# Altium footprint library SMT.PcbLib: 379 footprints (part 13 of 24) (continued)
## QFN50P1200X1200X90_HS-89N [mm] "QFN, 88-Leads, Body 12,00x12,00mm, Pitch 0,50mm, Thermal Pad 7,40x7,40mm, IPC Medium Density"
height 0.9
pads (89):
  rrect70% 1x0.3 smd paste+0 mask+0.03: 1(-6,5.25) 22(-6,-5.25) 45(6,-5.25) 66(6,5.25)
  rrect70% 1x0.3 smd paste+0 mask+0.04: 2(-6,4.75) 3(-6,4.25) 4(-6,3.75) 5(-6,3.25) 6(-6,2.75) 7(-6,2.25) 8(-6,1.75) 9(-6,1.25) 10(-6,0.75) 11(-6,0.25) 12(-6,-0.25) 13(-6,-0.75) 14(-6,-1.25) 15(-6,-1.75) 16(-6,-2.25) 17(-6,-2.75) 18(-6,-3.25) 19(-6,-3.75) 20(-6,-4.25) 21(-6,-4.75) 46(6,-4.75) 47(6,-4.25) 48(6,-3.75) 49(6,-3.25) 50(6,-2.75) 51(6,-2.25) 52(6,-1.75) 53(6,-1.25) 54(6,-0.75) 55(6,-0.25) 56(6,0.25) 57(6,0.75) 58(6,1.25) 59(6,1.75) 60(6,2.25) 61(6,2.75) 62(6,3.25) 63(6,3.75) 64(6,4.25) 65(6,4.75)
  rrect70% 0.3x1 smd paste+0 mask+0.03: 23(-5.25,-6) 44(5.25,-6) 67(5.25,6) 88(-5.25,6)
  rrect70% 0.3x1 smd paste+0 mask+0.04: 24(-4.75,-6) 25(-4.25,-6) 26(-3.75,-6) 27(-3.25,-6) 28(-2.75,-6) 29(-2.25,-6) 30(-1.75,-6) 31(-1.25,-6) 32(-0.75,-6) 33(-0.25,-6) 34(0.25,-6) 35(0.75,-6) 36(1.25,-6) 37(1.75,-6) 38(2.25,-6) 39(2.75,-6) 40(3.25,-6) 41(3.75,-6) 42(4.25,-6) 43(4.75,-6) 68(4.75,6) 69(4.25,6) 70(3.75,6) 71(3.25,6) 72(2.75,6) 73(2.25,6) 74(1.75,6) 75(1.25,6) 76(0.75,6) 77(0.25,6) 78(-0.25,6) 79(-0.75,6) 80(-1.25,6) 81(-1.75,6) 82(-2.25,6) 83(-2.75,6) 84(-3.25,6) 85(-3.75,6) 86(-4.25,6) 87(-4.75,6)
  rect 7.55x7.55 hole 0.3 copper offset 0.6,0.6 mask-20: EPAD(-0.6,-0.6)
via -3.1,3.1 diameter 0.7 hole 0.3
via -1.9,3.1 diameter 0.7 hole 0.3
via -3.1,1.9 diameter 0.7 hole 0.3
via -1.9,1.9 diameter 0.7 hole 0.3
via 0.6,1.9 diameter 0.7 hole 0.3
via -0.6,1.9 diameter 0.7 hole 0.3
via 0.6,3.1 diameter 0.7 hole 0.3
via -0.6,3.1 diameter 0.7 hole 0.3
via 0.6,-0.6 diameter 0.7 hole 0.3
via 0.6,0.6 diameter 0.7 hole 0.3
via -0.6,0.6 diameter 0.7 hole 0.3
via -1.9,-0.6 diameter 0.7 hole 0.3
via -3.1,-0.6 diameter 0.7 hole 0.3
via -1.9,0.6 diameter 0.7 hole 0.3
via -3.1,0.6 diameter 0.7 hole 0.3
via -1.9,-3.1 diameter 0.7 hole 0.3
via -3.1,-3.1 diameter 0.7 hole 0.3
via -1.9,-1.9 diameter 0.7 hole 0.3
via -3.1,-1.9 diameter 0.7 hole 0.3
via 0.6,-3.1 diameter 0.7 hole 0.3
via -0.6,-3.1 diameter 0.7 hole 0.3
via 0.6,-1.9 diameter 0.7 hole 0.3
via -0.6,-1.9 diameter 0.7 hole 0.3
via 3.1,-3.1 diameter 0.7 hole 0.3
via 1.9,-3.1 diameter 0.7 hole 0.3
via 3.1,-1.9 diameter 0.7 hole 0.3
via 1.9,-1.9 diameter 0.7 hole 0.3
via 3.1,-0.6 diameter 0.7 hole 0.3
via 1.9,-0.6 diameter 0.7 hole 0.3
via 3.1,0.6 diameter 0.7 hole 0.3
via 1.9,0.6 diameter 0.7 hole 0.3
via 3.1,1.9 diameter 0.7 hole 0.3
via 1.9,1.9 diameter 0.7 hole 0.3
via 3.1,3.1 diameter 0.7 hole 0.3
via 1.9,3.1 diameter 0.7 hole 0.3
Top Overlay:
  circle w0.15: c-6.85,5.925 r0.25
  lines w0.15: -6.2,-5.75 -6.2,-6.075 -5.75,-6.075 ; -6.2,5.75 -6.2,6.075 -5.75,6.075 ; 5.75,-6.075 6.2,-6.075 6.2,-5.75 ; 5.75,6.075 6.2,6.075 6.2,5.75
Top Paste:
  region: 1.515,-1.515 3.485,-1.515 3.485,-3.485 1.515,-3.485
  region: -0.985,-1.515 0.985,-1.515 0.985,-3.485 -0.985,-3.485
  region: -3.485,-1.515 -1.515,-1.515 -1.515,-3.485 -3.485,-3.485
  region: -3.485,0.985 -1.515,0.985 -1.515,-0.985 -3.485,-0.985
  region: -0.985,0.985 0.985,0.985 0.985,-0.985 -0.985,-0.985
  region: 1.515,0.985 3.485,0.985 3.485,-0.985 1.515,-0.985
  region: 1.515,3.485 3.485,3.485 3.485,1.515 1.515,1.515
  region: -0.985,3.485 0.985,3.485 0.985,1.515 -0.985,1.515
  region: -3.485,3.485 -1.515,3.485 -1.515,1.515 -3.485,1.515
Top Solder:
  region: 1.35,-1.35 3.65,-1.35 3.65,-3.65 1.35,-3.65
  region: -1.15,-1.35 1.15,-1.35 1.15,-3.65 -1.15,-3.65
  region: -3.65,-1.35 -1.35,-1.35 -1.35,-3.65 -3.65,-3.65
  region: 1.35,3.65 3.65,3.65 3.65,1.35 1.35,1.35
  region: -1.15,3.65 1.15,3.65 1.15,1.35 -1.15,1.35
  region: -3.65,3.65 -1.35,3.65 -1.35,1.35 -3.65,1.35
  region: 1.35,1.15 3.65,1.15 3.65,-1.15 1.35,-1.15
  region: -3.65,1.15 -1.35,1.15 -1.35,-1.15 -3.65,-1.15
  region: -1.15,1.15 1.15,1.15 1.15,-1.15 -1.15,-1.15
Bottom Solder:
  region: -4.005,4 4,4 4,-4 -4,-4
Mechanical 1:
  circle w0.2: c-5.1,4.975 r0.25
  lines w0.2: -6.05,-6.05 6.05,-6.05 6.05,6.05 -6.05,6.05 -6.05,-6.05
3D body "User Library-LFCSP_VQ88(CP-88-5).STEP": height 0.8, standoff 0, extent -6.01,-6.01 6.05,6.05

## QFN51P300X300X89_HS-13N [mm] "QFN, 12-Leads, Body 3,00x3,00mm, Pitch 0,51mm, Thermal Pad 1,45x1,45mm, IPC Medium Density"
height 0.89
pads (13):
  rect 0.51x0.25 smd paste+0 mask+0.05: 1(-1.36,0.51) 2(-1.36,0) 3(-1.36,-0.51) 7(1.36,-0.51) 8(1.36,0) 9(1.36,0.51)
  rect 0.25x0.51 smd paste+0 mask+0.05: 4(-0.51,-1.36) 5(0,-1.36) 6(0.51,-1.36) 10(0.51,1.36) 11(0,1.36) 12(-0.51,1.36)
  rect 1.25x1.25 hole 0.2 paste+0.1: EPAD(0,0)
via 0,0.4 diameter 0.45 hole 0.2
via 0,-0.4 diameter 0.45 hole 0.2
via 0.4,0 diameter 0.45 hole 0.2
via -0.4,0 diameter 0.45 hole 0.2
via -0.4,0.4 diameter 0.45 hole 0.2
via -0.4,-0.4 diameter 0.45 hole 0.2
via 0.4,-0.4 diameter 0.45 hole 0.2
via 0.4,0.4 diameter 0.45 hole 0.2
Top Overlay:
  circle w0.15: c-2.3,0.9 r0.25
  lines w0.15: -1.65,-1 -1.65,-1.65 -1,-1.65 ; -1.65,1 -1.65,1.65 -1,1.65 ; 1,-1.65 1.65,-1.65 1.65,-1 ; 1,1.65 1.65,1.65 1.65,1
Top Paste:
  rectangle: -0.5,-0.5 0.5,0.5
Mechanical 1:
  circle w0.2: c-0.9,0.9 r0.25
  lines w0.2: -1.5,-1.5 1.5,-1.5 1.5,1.5 -1.5,1.5 -1.5,-1.5
Mechanical 5:
  lines w0.1: -0.8,-0.8 0.8,-0.8 0.8,0.8 -0.8,0.8 -0.8,-0.8
Mechanical 20:
  text "Рекомендуется заполнить /  отверстия (слой Mech5)" at -4.4,1.8 h1
3D body "GP2X1.stp": height 0.89, standoff 0, extent -1.5,-1.5 1.5,1.5

## QFN51P500X500X100_HS-33N [mm] "QFN, 32-Leads, Body 5,00x5,00mm, Pitch 0,51mm, Thermal Pad 2,80x2,80mm, IPC Medium Density"
height 1
pads (33):
  oval 0.9x0.3 smd paste-0.01 mask+0.04: 1(-2.45,1.785) 2(-2.45,1.275) 3(-2.45,0.765) 4(-2.45,0.255) 5(-2.45,-0.255) 6(-2.45,-0.765) 7(-2.45,-1.275) 8(-2.45,-1.785) 17(2.45,-1.785) 18(2.45,-1.275) 19(2.45,-0.765) 20(2.45,-0.255) 21(2.45,0.255) 22(2.45,0.765) 23(2.45,1.275) 24(2.45,1.785)
  oval 0.3x0.9 smd paste-0.01 mask+0.04: 9(-1.785,-2.45) 10(-1.275,-2.45) 11(-0.765,-2.45) 12(-0.255,-2.45) 13(0.255,-2.45) 14(0.765,-2.45) 15(1.275,-2.45) 16(1.785,-2.45) 25(1.785,2.45) 26(1.275,2.45) 27(0.765,2.45) 28(0.255,2.45) 29(-0.255,2.45) 30(-0.765,2.45) 31(-1.275,2.45) 32(-1.785,2.45)
  rect 2.8x2.8 hole 0.3 mask+0.03: EPAD(0,0)
via -1.6,0 diameter 0.55 hole 0.3
via -1.016,0 diameter 0.55 hole 0.3
via -0.508,0 diameter 0.55 hole 0.3
via 0,0.508 diameter 0.55 hole 0.3
via 0,1.016 diameter 0.55 hole 0.3
via 0.508,0 diameter 0.55 hole 0.3
via 1.016,0 diameter 0.55 hole 0.3
via 1.6,0 diameter 0.55 hole 0.3
via 0,1.6 diameter 0.55 hole 0.3
via 0.508,1.6 diameter 0.55 hole 0.3
via 0.508,1.016 diameter 0.55 hole 0.3
via 0.508,0.508 diameter 0.55 hole 0.3
via 1.016,1.6 diameter 0.55 hole 0.3
via 1.016,1.016 diameter 0.55 hole 0.3
via 1.016,0.508 diameter 0.55 hole 0.3
via 1.6,1.6 diameter 0.55 hole 0.3
via 1.6,1.016 diameter 0.55 hole 0.3
via 1.6,0.508 diameter 0.55 hole 0.3
via -0.508,1.6 diameter 0.55 hole 0.3
via -0.508,1.016 diameter 0.55 hole 0.3
via -0.508,0.508 diameter 0.55 hole 0.3
via -1.016,1.6 diameter 0.55 hole 0.3
via -1.016,1.016 diameter 0.55 hole 0.3
via -1.016,0.508 diameter 0.55 hole 0.3
via -1.6,1.6 diameter 0.55 hole 0.3
via -1.6,1.016 diameter 0.55 hole 0.3
via -1.6,0.508 diameter 0.55 hole 0.3
via -1.6,-1.6 diameter 0.55 hole 0.3
via -1.6,-1.016 diameter 0.55 hole 0.3
via -1.6,-0.508 diameter 0.55 hole 0.3
via -1.016,-1.6 diameter 0.55 hole 0.3
via -1.016,-1.016 diameter 0.55 hole 0.3
via -1.016,-0.508 diameter 0.55 hole 0.3
via -0.508,-1.6 diameter 0.55 hole 0.3
via -0.508,-1.016 diameter 0.55 hole 0.3
via -0.508,-0.508 diameter 0.55 hole 0.3
via 0,-1.6 diameter 0.55 hole 0.3
via 0,-1.016 diameter 0.55 hole 0.3
via 0,-0.508 diameter 0.55 hole 0.3
via 0.508,-1.6 diameter 0.55 hole 0.3
via 0.508,-1.016 diameter 0.55 hole 0.3
via 0.508,-0.508 diameter 0.55 hole 0.3
via 1.016,-1.6 diameter 0.55 hole 0.3
via 1.016,-1.016 diameter 0.55 hole 0.3
via 1.016,-0.508 diameter 0.55 hole 0.3
via 1.6,-1.6 diameter 0.55 hole 0.3
via 1.6,-1.016 diameter 0.55 hole 0.3
via 1.6,-0.508 diameter 0.55 hole 0.3
Top Overlay:
  circle w0.15: c-3.3,2.5 r0.25
  lines w0.15: -2.65,-2.31 -2.65,-2.65 -2.31,-2.65 ; -2.65,2.31 -2.65,2.65 -2.31,2.65 ; 2.31,-2.65 2.65,-2.65 2.65,-2.31 ; 2.31,2.65 2.65,2.65 2.65,2.31
Top Paste:
  rectangle: -1.2,-1.2 -0.2,-0.2
  region: 1.2,-0.2 0.2,-0.2 0.2,-1.2 1.2,-1.2
  region: 1.2,1.2 0.2,1.2 0.2,0.2 1.2,0.2
  rectangle: -1.2,0.2 -0.2,1.2
Mechanical 1:
  circle w0.2: c-1.55,1.55 r0.25
  lines w0.2: -2.5,-2.5 -2.5,2.5 2.5,2.5 2.5,-2.5 -2.5,-2.5
Mechanical 5:
  lines w0.15: -1.9,-1.9 -1.9,1.9 1.9,1.9 1.9,-1.9 -1.9,-1.9
Mechanical 20:
  text "Рекомендуется заполнение отверстий  / Прошивка см. PDF / Шаг отв.0,5  для материала не более 0,254" at -7.9,3 h1
3D body "QFN51P500X500X100_HS-33N.step": height 1, standoff 0, extent -2.501,-2.501 2.501,2.501

## QFN65P400X400X80_HS215X215-17N [mm] "QFN, 16-Leads, Body 4,00x4,00mm, Pitch 0,65mm, Thermal Pad 2,15x2,15mm, IPC Medium Density"
height 0.8
pads (17):
  rrect50% 0.72x0.3 smd mask+0.05: 1(-1.815,0.975) 2(-1.815,0.325) 3(-1.815,-0.325) 4(-1.815,-0.975) 9(1.815,-0.975) 10(1.815,-0.325) 11(1.815,0.325) 12(1.815,0.975)
  rrect50% 0.3x0.72 smd mask+0.05: 5(-0.975,-1.815) 6(-0.325,-1.815) 7(0.325,-1.815) 8(0.975,-1.815) 13(0.975,1.815) 14(0.325,1.815) 15(-0.325,1.815) 16(-0.975,1.815)
  rect 2.15x2.15 hole 0.3 copper offset 0.25,0.25: EPAD(-0.25,-0.25)
via 0.25,-0.25 diameter 0.6 hole 0.3
via 0.75,0.25 diameter 0.6 hole 0.3
via 0.75,-0.25 diameter 0.6 hole 0.3
via -0.75,0.25 diameter 0.6 hole 0.3
via -0.75,-0.25 diameter 0.6 hole 0.3
via 0.25,0.75 diameter 0.6 hole 0.3
via -0.25,0.75 diameter 0.6 hole 0.3
via -0.75,0.75 diameter 0.6 hole 0.3
via 0.75,0.75 diameter 0.6 hole 0.3
via 0.75,-0.75 diameter 0.6 hole 0.3
via -0.25,-0.75 diameter 0.6 hole 0.3
via 0.25,-0.75 diameter 0.6 hole 0.3
via 0.25,0.25 diameter 0.6 hole 0.3
via -0.25,0.25 diameter 0.6 hole 0.3
via -0.75,-0.75 diameter 0.6 hole 0.3
Top Overlay:
  circle w0.15: c-2.75,1 r0.25
  lines w0.15: -2.15,-1.5 -2.15,-2.15 -1.5,-2.15 ; -2.15,1.5 -2.15,2.15 -1.5,2.15 ; 1.5,-2.15 2.15,-2.15 2.15,-1.5 ; 1.5,2.15 2.15,2.15 2.15,1.5
Top Paste:
  rectangle: -0.9,0.2 -0.2,0.9
  region: 0.9,0.9 0.2,0.9 0.2,0.2 0.9,0.2
  region: 0.9,-0.2 0.2,-0.2 0.2,-0.9 0.9,-0.9
  rectangle: -0.9,-0.9 -0.2,-0.2
Mechanical 1:
  circle w0.2: c-1.25,1.25 r0.25
  lines w0.2: -2,-2 -2,2 2,2 2,-2 -2,-2
3D body "User Library-QFN-16-1.STEP": height 0.86, standoff 0.01, extent -2.085,-2.085 2.085,2.085

## QFN65P400X400X80_HS-17N [mm] "QFN, 16-Leads, Body 4,00x4,00mm, Pitch 0,65mm, Thermal Pad 2,10x2,10mm, IPC Medium Density"
height 0.8
pads (17):
  rrect50% 0.8x0.3 smd mask+0.03: 1(-1.8,0.975) 2(-1.8,0.325) 3(-1.8,-0.325) 4(-1.8,-0.975) 9(1.8,-0.975) 10(1.8,-0.325) 11(1.8,0.325) 12(1.8,0.975)
  rrect50% 0.3x0.8 smd mask+0.03: 5(-0.975,-1.8) 6(-0.325,-1.8) 7(0.325,-1.8) 8(0.975,-1.8) 13(0.975,1.8) 14(0.325,1.8) 15(-0.325,1.8) 16(-0.975,1.8)
  rect 2.1x2.1 hole 0.3: EPAD(0,0)
via -0.55,0.55 diameter 0.5 hole 0.2
via 0.55,0.55 diameter 0.5 hole 0.2
via -0.55,-0.55 diameter 0.5 hole 0.2
via 0.55,-0.55 diameter 0.5 hole 0.2
Top Overlay:
  circle w0.15: c-2.75,1 r0.25
  lines w0.15: -2.15,-1.5 -2.15,-2.15 -1.5,-2.15 ; -2.15,1.5 -2.15,2.15 -1.5,2.15 ; 1.5,-2.15 2.15,-2.15 2.15,-1.5 ; 1.5,2.15 2.15,2.15 2.15,1.5
Top Paste:
  rectangle: -0.9,0.2 -0.2,0.9
  region: 0.9,0.9 0.2,0.9 0.2,0.2 0.9,0.2
  region: 0.9,-0.2 0.2,-0.2 0.2,-0.9 0.9,-0.9
  rectangle: -0.9,-0.9 -0.2,-0.2
Mechanical 1:
  circle w0.2: c-1.25,1.25 r0.25
  lines w0.2: -2,-2 -2,2 2,2 2,-2 -2,-2
3D body "User Library-QFN-16-1.STEP": height 0.86, standoff 0.01, extent -2.085,-2.085 2.085,2.085

## QFN65P400X400X100_HS-17N [mm] "QFN, 16-Leads, Body 4,00x4,00mm, Pitch 0,65mm, Thermal Pad 2,65x2,65mm, IPC Medium Density"
height 1
pads (17):
  oval 0.65x0.3 smd: 1(-2.025,0.975) 2(-2.025,0.325) 3(-2.025,-0.325) 4(-2.025,-0.975) 9(2.025,-0.975) 10(2.025,-0.325) 11(2.025,0.325) 12(2.025,0.975)
  oval 0.3x0.65 smd: 5(-0.975,-2.025) 6(-0.325,-2.025) 7(0.325,-2.025) 8(0.975,-2.025) 13(0.975,2.025) 14(0.325,2.025) 15(-0.325,2.025) 16(-0.975,2.025)
  rect 2.65x2.65 hole 0.3: EPAD(0,0)
via 0.6,-0.6 diameter 0.6 hole 0.3
via -0.6,-0.6 diameter 0.6 hole 0.3
via 0.6,0.6 diameter 0.6 hole 0.3
via -0.6,0.6 diameter 0.6 hole 0.3
Top Overlay:
  circle w0.15: c-2.8,1.4 r0.25
  lines w0.15: -2.15,-1.5 -2.15,-2.15 -1.5,-2.15 ; -2.15,1.5 -2.15,2.15 -1.5,2.15 ; 1.5,-2.15 2.15,-2.15 2.15,-1.5 ; 1.5,2.15 2.15,2.15 2.15,1.5
Top Paste:
  rectangle: -1,0.2 -0.2,1
  rectangle: 0.2,0.2 1,1
  rectangle: 0.2,-1 1,-0.2
  rectangle: -1,-1 -0.2,-0.2
Mechanical 1:
  circle w0.2: c-1.1,1 r0.25
  lines w0.2: -2,-2 2,-2 2,2 -2,2 -2,-2
3D body "User Library-QFN-16-1.STEP": height 0.86, standoff 0.01, extent -2.085,-2.085 2.085,2.085

## QFN66P300X300X89_HS-9N [mm] "QFN, 8-Leads, Body 3,00x3,00mm, Pitch 0,66mm, Thermal Pad 1,70x1,70mm, IPC Medium Density"
height 0.89
pads (9):
  rrect50% 0.8x0.3 smd mask+0.03: 1(-1.485,0.33) 2(-1.485,-0.33) 5(1.485,-0.33) 6(1.485,0.33)
  rrect50% 0.3x0.8 smd mask+0.03: 3(-0.33,-1.485) 4(0.33,-1.485) 7(0.33,1.485) 8(-0.33,1.485)
  rect 1.7x1.7 hole 0.3: EPAD(0,0)
via 0.5,0.5 diameter 0.6 hole 0.3
via -0.5,0.5 diameter 0.6 hole 0.3
via -0.5,-0.5 diameter 0.6 hole 0.3
via 0.5,-0.5 diameter 0.6 hole 0.3
Top Overlay:
  circle w0.15: c-2.5,0.25 r0.25
  lines w0.15: -1.65,-0.855 -1.65,-1.65 -0.855,-1.65 ; -1.65,0.855 -1.65,1.65 -0.855,1.65 ; 0.855,-1.65 1.65,-1.65 1.65,-0.855 ; 0.855,1.65 1.65,1.65 1.65,0.855
Top Paste:
  rectangle: -0.65,-0.65 0.65,0.65
Mechanical 1:
  circle w0.2: c-1,0.75 r0.25
  lines w0.2: -1.5,-1.5 1.5,-1.5 1.5,1.5 -1.5,1.5 -1.5,-1.5
3D body "QFN66P300X300X89_HS-9N.stp": height 0.96, standoff 0.01, extent -1.5,-1.5 1.5,1.5

## QFN80P400X400X80_HS-11N [mm] "QFN, 10-Leads, Body 4,00x4,00mm, Pitch 0,80mm, Thermal Pad 3,00x2,60mm, IPC Medium Density"
height 0.8
pads (11):
  rrect50% 0.35x0.85 smd paste-0.05 mask+0.07: 1(-1.6,-2) 2(-0.8,-2) 3(0,-2) 4(0.8,-2) 5(1.6,-2) 6(1.6,2) 7(0.8,2) 8(0,2) 9(-0.8,2) 10(-1.6,2)
  rect 3x2.6 hole 0.3 paste-10 mask+0.07: EPAD(0,0)
via 0.75,0.75 diameter 0.7 hole 0.3
via 0.75,-0.75 diameter 0.7 hole 0.3
via -0.75,0.75 diameter 0.7 hole 0.3
via -0.75,-0.75 diameter 0.7 hole 0.3
Top Overlay:
  circle w0.2: c-2.3,-2.6 r0.25
  lines w0.15: -2.2,-2 -2.2,2 ; 2.2,-1.9 2.2,2
Top Paste:
  rectangle: 0.15,0.15 1.3,1.3
  rectangle: 0.15,-1.3 1.3,-0.15
  region: -0.15,-0.15 -1.3,-0.15 -1.3,-1.3 -0.15,-1.3
  region: -0.15,1.3 -1.3,1.3 -1.3,0.15 -0.15,0.15
Mechanical 1:
  circle w0.2: c-1.3,-1.4 r0.25
  lines w0.2: -2,-2 -2,2 2,2 2,-2 -2,-2
3D body "DPR (S-PWSON-N10).stp": height 0.8, standoff 0, extent -2,-2 2,2

## QFN90P900X1100X290-32N [mm] "QFN, 32-Leads, Body 9,00x11,00mm, Pitch 0,90mm, IPC Medium Density"
height 2.9
pads (41):
  rect 1.7x1.6 smd paste-5 mask+0.07: 1(-5.05,-4.1) 11(5.05,-4.1) 19(5.05,4.1) 29(-5.05,4.1)
  rect 0.6x0.95 smd paste-0.025 mask+0.07: 2(-3.6,-4.425) 3(-2.7,-4.425) 4(-1.8,-4.425) 5(-0.9,-4.425) 6(0,-4.425) 7(0.9,-4.425) 8(1.8,-4.425) 9(2.7,-4.425) 10(3.6,-4.425) 20(3.6,4.425) 21(2.7,4.425) 22(1.8,4.425) 23(0.9,4.425) 24(0,4.425) 25(-0.9,4.425) 26(-1.8,4.425) 27(-2.7,4.425) 28(-3.6,4.425)
  rect 0.95x0.6 smd paste-0.025 mask+0.07: 12(5.425,-2.7) 13(5.425,-1.8) 14(5.425,-0.9) 15(5.425,0) 16(5.425,0.9) 17(5.425,1.8) 18(5.425,2.7) 30(-5.425,2.7) 31(-5.425,1.8) 32(-5.425,0.9) 33(-5.425,0) 34(-5.425,-0.9) 35(-5.425,-1.8) 36(-5.425,-2.7)
  rect 2.3x2.25 smd paste-10 mask+0.07: 37(-3.3,-0.22)
  rect 2.2x3.1 smd paste-10 mask+0.07: 38(0.11,-1.3) 39(3.59,-1.3)
  rect 1.24x1.4 smd paste-10 mask+0.07: 40(4.06,2.33)
  rect 3.05x2.04 smd paste-10 mask+0.07: 41(1.32,2.65)
via -4.08,0.64 diameter 0.52 hole 0.3
via -3.3,0.64 diameter 0.52 hole 0.3
via -2.52,0.64 diameter 0.52 hole 0.3
via -2.52,-1.08 diameter 0.52 hole 0.3
via -3.3,-1.08 diameter 0.52 hole 0.3
via -4.08,-1.08 diameter 0.52 hole 0.3
Top Overlay:
  circle w0.15: c-5,-5.7 r0.25
  lines w0.15: -6.15,-3.375 -6.15,-5.1 -4.275,-5.1 ; -6.15,3.375 -6.15,5.1 -4.275,5.1 ; 4.275,-5.1 6.15,-5.1 6.15,-3.375 ; 4.275,5.1 6.15,5.1 6.15,3.375
Top Paste:
  rectangle: 3.54,2.48 4.58,2.98
  rectangle: 3.54,1.68 4.58,2.18
  rectangle: 2.64,-2.73 3.44,-1.45
  rectangle: 3.74,-2.73 4.54,-1.45
  rectangle: 3.74,-1.15 4.54,0.13
  rectangle: 2.64,-1.15 3.44,0.13
  rectangle: -0.84,-1.15 -0.04,0.13
  rectangle: 0.26,-1.15 1.06,0.13
  rectangle: 0.26,-2.73 1.06,-1.45
  rectangle: -0.84,-2.73 -0.04,-1.45
  rectangle: -3.15,-0.645 -2.3,0.205
  rectangle: -4.3,-0.645 -3.45,0.205
  rectangle: -5.787,3.48 -4.315,4.72
  rectangle: 4.313,3.48 5.785,4.72
  rectangle: 4.313,-4.72 5.785,-3.48
  rectangle: -5.787,-4.72 -4.315,-3.48
  rectangle: -0.11,1.77 1.17,2.5
  rectangle: -0.11,2.8 1.17,3.53
  rectangle: 1.47,2.8 2.75,3.53
  rectangle: 1.47,1.77 2.75,2.5
Top Solder:
  rectangle: -4.52,-0.77 -2.08,0.33
Mechanical 1:
  circle w0.2: c-4.55,-3.55 r0.25
  lines w0.2: -5.5,-4.5 5.5,-4.5 5.5,4.5 -5.5,4.5 -5.5,-4.5
3D body: height 0.25, standoff 0, extent -4.922,-9.024 -4.922,-9.024
3D body "RKG0041A.stp": height 2.9, standoff 0, extent -5.5,-4.5 5.5,4.5

## QFN127P600X500X80_HS-9N [mm] "QFN, 8-Leads, Body 6,00x5,00mm, Pitch 0,00mm/1,27mm, Thermal Pad 3,00x3,00mm, IPC Medium Density"
height 0.8
pads (9):
  rect 1.05x0.4 smd: 1(-2.9,1.905) 2(-2.9,0.635) 3(-2.9,-0.635) 4(-2.9,-1.905) 5(2.9,-1.905) 6(2.9,-0.635) 7(2.9,0.635) 8(2.9,1.905)
  rect 3x3 hole 0.3: EPAD(0,0)
via 1.1,-1.1 diameter 0.7 hole 0.3
via 0,-1.1 diameter 0.7 hole 0.3
via -1.1,-1.1 diameter 0.7 hole 0.3
via 1.1,0 diameter 0.7 hole 0.3
via -1.1,0 diameter 0.7 hole 0.3
via 1.1,1.1 diameter 0.7 hole 0.3
via 0,1.1 diameter 0.7 hole 0.3
via -1.1,1.1 diameter 0.7 hole 0.3
Top Overlay:
  circle w0.15: c-3.8,2.5 r0.25
  lines w0.15: -3.2,-2.4 -3.2,-2.7 3.2,-2.7 3.2,-2.4 ; -3.2,2.4 -3.2,2.7 3.2,2.7 3.2,2.4
Top Paste:
  rectangle: -0.9,-0.9 0.9,0.9
Mechanical 1:
  circle w0.2: c-2.05,1.55 r0.25
  lines w0.2: -3,-2.5 3,-2.5 3,2.5 -3,2.5 -3,-2.5
3D body "QFN0P600X500X80_HS-9N.step": height 0.8, standoff 0, extent -3.001,-2.5 3.001,2.5

## QFP40P3002X3002X140-257N [mm] "QFP, 256-Leads, Body 30x30mm (max), Pitch 0,40mm, IPC Medium Density"
height 1.6
pads (257):
  rect 0.25x1.6 smd mask+0.01: 1(-12.6,-15) 2(-12.2,-15) 3(-11.8,-15) 4(-11.4,-15) 5(-11,-15) 6(-10.6,-15) 7(-10.2,-15) 8(-9.8,-15) 9(-9.4,-15) 10(-9,-15) 11(-8.6,-15) 12(-8.2,-15) 13(-7.8,-15) 14(-7.4,-15) 15(-7,-15) 16(-6.6,-15) 17(-6.2,-15) 18(-5.8,-15) 19(-5.4,-15) 20(-5,-15) 21(-4.6,-15) 22(-4.2,-15) 23(-3.8,-15) 24(-3.4,-15) 25(-3,-15) 26(-2.6,-15) 27(-2.2,-15) 28(-1.8,-15) 29(-1.4,-15) 30(-1,-15) 31(-0.6,-15) 32(-0.2,-15) 33(0.2,-15) 34(0.6,-15) 35(1,-15) 36(1.4,-15) 37(1.8,-15) 38(2.2,-15) 39(2.6,-15) 40(3,-15) 41(3.4,-15) 42(3.8,-15) 43(4.2,-15) 44(4.6,-15) 45(5,-15) 46(5.4,-15) 47(5.8,-15) 48(6.2,-15) 49(6.6,-15) 50(7,-15) 51(7.4,-15) 52(7.8,-15) 53(8.2,-15) 54(8.6,-15) 55(9,-15) 56(9.4,-15) 57(9.8,-15) 58(10.2,-15) 59(10.6,-15) 60(11,-15) 61(11.4,-15) 62(11.8,-15) 63(12.2,-15) 64(12.6,-15) 129(12.6,15) 130(12.2,15) 131(11.8,15) 132(11.4,15) 133(11,15) 134(10.6,15) 135(10.2,15) 136(9.8,15) 137(9.4,15) 138(9,15) 139(8.6,15) 140(8.2,15) 141(7.8,15) 142(7.4,15) 143(7,15) 144(6.6,15) 145(6.2,15) 146(5.8,15) 147(5.4,15) 148(5,15) 149(4.6,15) 150(4.2,15) 151(3.8,15) 152(3.4,15) 153(3,15) 154(2.6,15) 155(2.2,15) 156(1.8,15) 157(1.4,15) 158(1,15) 159(0.6,15) 160(0.2,15) 161(-0.2,15) 162(-0.6,15) 163(-1,15) 164(-1.4,15) 165(-1.8,15) 166(-2.2,15) 167(-2.6,15) 168(-3,15) 169(-3.4,15) 170(-3.8,15) 171(-4.2,15) 172(-4.6,15) 173(-5,15) 174(-5.4,15) 175(-5.8,15) 176(-6.2,15) 177(-6.6,15) 178(-7,15) 179(-7.4,15) 180(-7.8,15) 181(-8.2,15) 182(-8.6,15) 183(-9,15) 184(-9.4,15) 185(-9.8,15) 186(-10.2,15) 187(-10.6,15) 188(-11,15) 189(-11.4,15) 190(-11.8,15) 191(-12.2,15) 192(-12.6,15)
  rect 1.6x0.25 smd mask+0.01: 65(15,-12.6) 66(15,-12.2) 67(15,-11.8) 68(15,-11.4) 69(15,-11) 70(15,-10.6) 71(15,-10.2) 72(15,-9.8) 73(15,-9.4) 74(15,-9) 75(15,-8.6) 76(15,-8.2) 77(15,-7.8) 78(15,-7.4) 79(15,-7) 80(15,-6.6) 81(15,-6.2) 82(15,-5.8) 83(15,-5.4) 84(15,-5) 85(15,-4.6) 86(15,-4.2) 87(15,-3.8) 88(15,-3.4) 89(15,-3) 90(15,-2.6) 91(15,-2.2) 92(15,-1.8) 93(15,-1.4) 94(15,-1) 95(15,-0.6) 96(15,-0.2) 97(15,0.2) 98(15,0.6) 99(15,1) 100(15,1.4) 101(15,1.8) 102(15,2.2) 103(15,2.6) 104(15,3) 105(15,3.4) 106(15,3.8) 107(15,4.2) 108(15,4.6) 109(15,5) 110(15,5.4) 111(15,5.8) 112(15,6.2) 113(15,6.6) 114(15,7) 115(15,7.4) 116(15,7.8) 117(15,8.2) 118(15,8.6) 119(15,9) 120(15,9.4) 121(15,9.8) 122(15,10.2) 123(15,10.6) 124(15,11) 125(15,11.4) 126(15,11.8) 127(15,12.2) 128(15,12.6) 193(-15,12.6) 194(-15,12.2) 195(-15,11.8) 196(-15,11.4) 197(-15,11) 198(-15,10.6) 199(-15,10.2) 200(-15,9.8) 201(-15,9.4) 202(-15,9) 203(-15,8.6) 204(-15,8.2) 205(-15,7.8) 206(-15,7.4) 207(-15,7) 208(-15,6.6) 209(-15,6.2) 210(-15,5.8) 211(-15,5.4) 212(-15,5) 213(-15,4.6) 214(-15,4.2) 215(-15,3.8) 216(-15,3.4) 217(-15,3) 218(-15,2.6) 219(-15,2.2) 220(-15,1.8) 221(-15,1.4) 222(-15,1) 223(-15,0.6) 224(-15,0.2) 225(-15,-0.2) 226(-15,-0.6) 227(-15,-1) 228(-15,-1.4) 229(-15,-1.8) 230(-15,-2.2) 231(-15,-2.6) 232(-15,-3) 233(-15,-3.4) 234(-15,-3.8) 235(-15,-4.2) 236(-15,-4.6) 237(-15,-5) 238(-15,-5.4) 239(-15,-5.8) 240(-15,-6.2) 241(-15,-6.6) 242(-15,-7) 243(-15,-7.4) 244(-15,-7.8) 245(-15,-8.2) 246(-15,-8.6) 247(-15,-9) 248(-15,-9.4) 249(-15,-9.8) 250(-15,-10.2) 251(-15,-10.6) 252(-15,-11) 253(-15,-11.4) 254(-15,-11.8) 255(-15,-12.2) 256(-15,-12.6)
  rect 15x15 hole 0.3 paste-50 mask-25.4: 257(0,0)
via 6,-6 diameter 0.8 hole 0.3
via 4,-4 diameter 0.8 hole 0.3
via 2,-6 diameter 0.8 hole 0.3
via 0,-4 diameter 0.8 hole 0.3
via -2,-6 diameter 0.8 hole 0.3
via -6,-6 diameter 0.8 hole 0.3
via -4,-4 diameter 0.8 hole 0.3
via 6,6 diameter 0.8 hole 0.3
via 4,4 diameter 0.8 hole 0.3
via 2,6 diameter 0.8 hole 0.3
via 0,4 diameter 0.8 hole 0.3
via -2,6 diameter 0.8 hole 0.3
via -6,6 diameter 0.8 hole 0.3
via -4,4 diameter 0.8 hole 0.3
via -6,-2 diameter 0.8 hole 0.3
via -6,2 diameter 0.8 hole 0.3
via -4,0 diameter 0.8 hole 0.3
via 6,-2 diameter 0.8 hole 0.3
via 6,2 diameter 0.8 hole 0.3
via 4,0 diameter 0.8 hole 0.3
via 2,-2 diameter 0.8 hole 0.3
via -2,-2 diameter 0.8 hole 0.3
via 2,2 diameter 0.8 hole 0.3
via -2,2 diameter 0.8 hole 0.3
Top Overlay:
  circle w0.15: c-14.5,-14.6 r0.3
  lines w0.15: -14,-14 -14,14 14,14 14,-14 -14,-14
Top Paste:
  region: -3.5,-3.5 3.5,-3.5 3.5,3.5 -3.5,3.5
Top Solder:
  region: -7.7,-7.7 7.7,-7.7 7.7,7.7 -7.7,7.7
Bottom Solder:
  region: -7.7,-7.7 7.7,-7.7 7.7,7.7 -7.7,7.7
Mechanical 1:
  circle w0.2: c-12.6,-13.4 r0.3
  lines w0.2: -14,-14 -14,14 14,14 14,-14 -14,-14
3D body "User Library-QFP (MS-026)LQFP-256 (MS-026-BJC).STEP": height 1.42, standoff -0.08, extent -15.004,-15.004 15.004,15.004